# Altium footprint library MyLibrarySum.PcbLib: 208 footprints (part 3 of 13)
Each footprint in its own frame and in the unit in brackets; x right, y up, seen from the top. Pads: shape width x height; smd on the part's side, far side on the other; paste and mask are expansions set on the pad; w line width, h text height; cw(c..) or ccw(c..) is an arc to the next point about the centre after c.
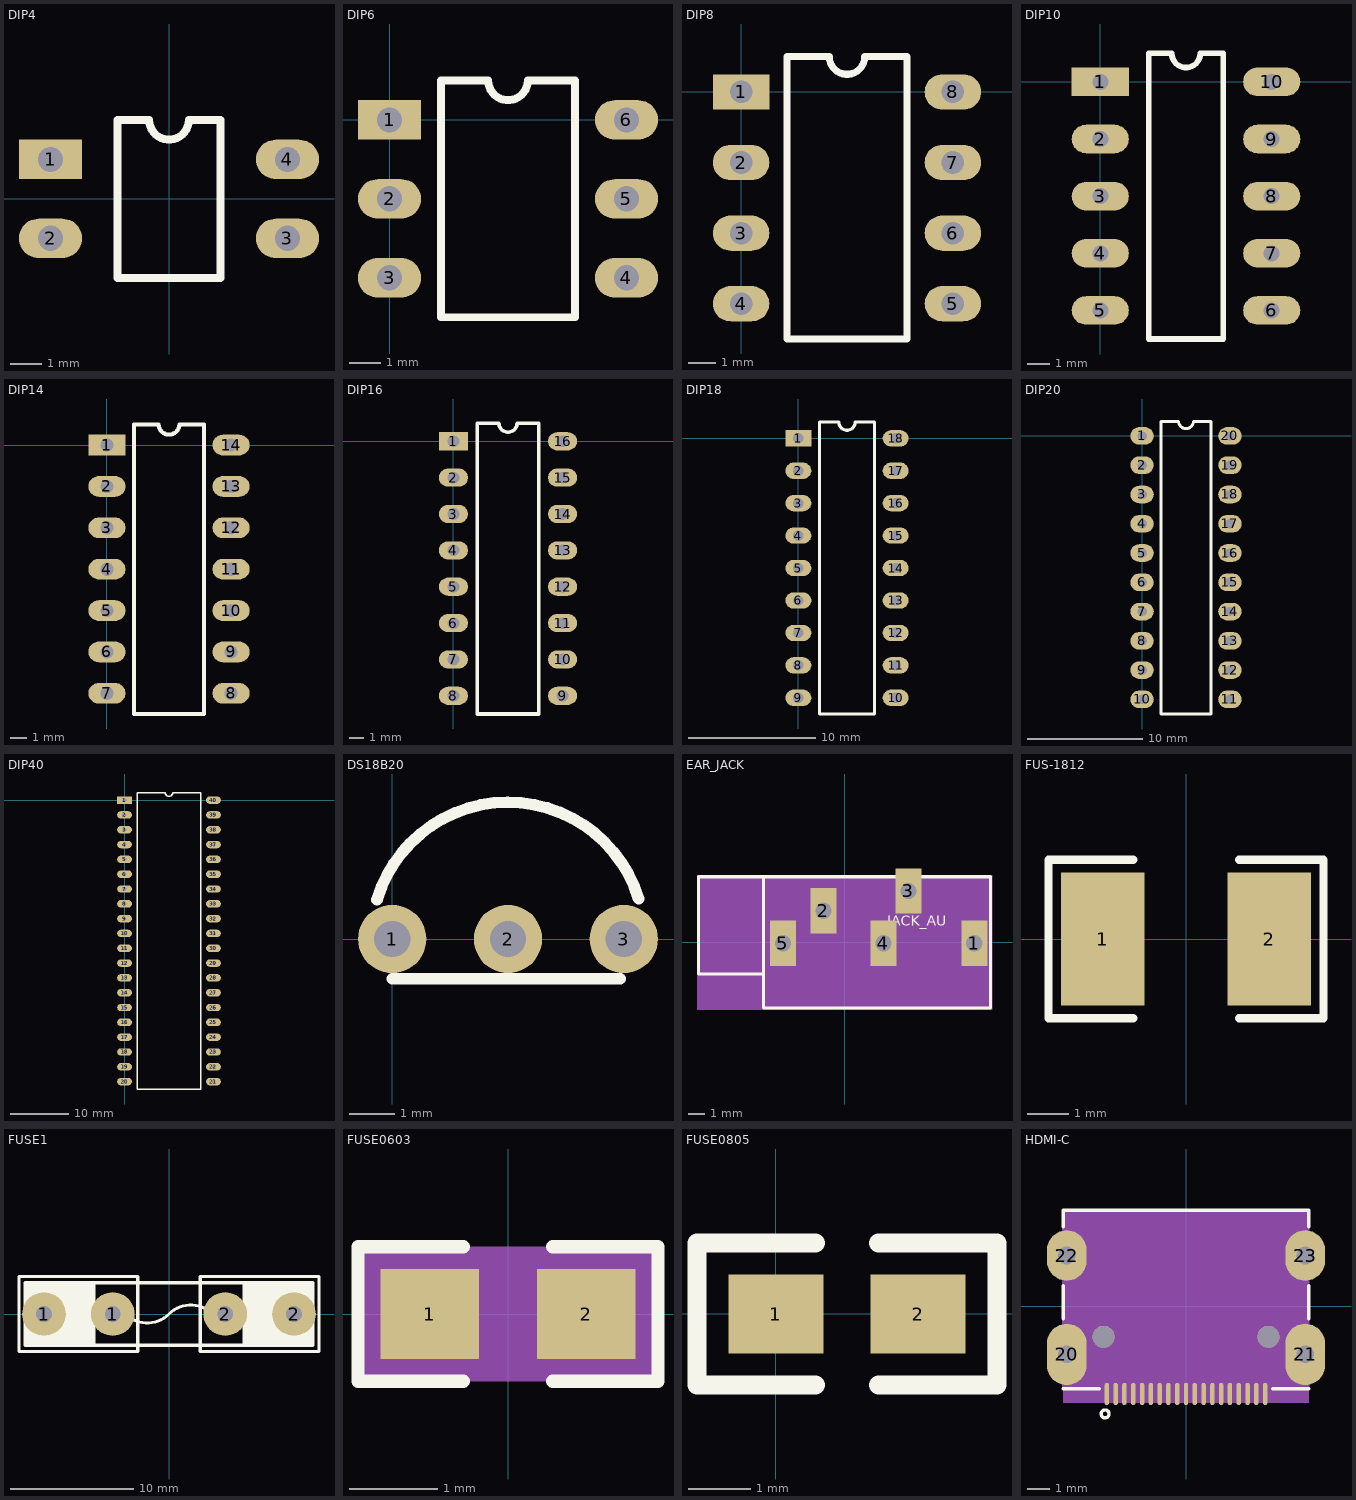
[diagram p2: the footprints below, top view; thin cyan lines are the x and y axes]

## DIP4 [mil]
pads (4):
  rect 80x50 hole 32: 1(-150,50)
  oval 80x50 hole 32: 2(-150,-50) 3(150,-50) 4(150,50)
Top Overlay:
  lines w10: -65,-100 -65,100 -25,100 ccw(c0,100) 25,100 65,100 65,-100 -65,-100
3D body: height 169.69, standoff -129.13, extent -147.48,-125 167.48,93.11

## DIP6 [mil]
pads (6):
  rect 80x50 hole 32: 1(0,0)
  oval 80x50 hole 32: 2(0,-100) 3(0,-200) 4(300,-200) 5(300,-100) 6(300,0)
Top Overlay:
  lines w10: 65,-250 235,-250 235,50 175,50 cw(c150,50) 125,50 65,50 65,-250
3D body: height 169.69, standoff -129.13, extent -17.48,-240 297.48,78.11

## DIP8 [mil]
pads (8):
  rect 80x50 hole 32: 1(0,0)
  oval 80x50 hole 32: 2(0,-100) 3(0,-200) 4(0,-300) 5(300,-300) 6(300,-200) 7(300,-100) 8(300,0)
Top Overlay:
  lines w10: 65,-350 65,50 125,50 ccw(c150,50) 175,50 235,50 235,-350 65,-350
3D body: height 177.17, standoff -137.8, extent -0.54,-357.6 305,67.6

## DIP10 [mil]
pads (10):
  rect 100x50 hole 28: 1(0,0)
  oval 100x50 hole 28: 2(0,-100) 3(0,-200) 4(0,-300) 5(0,-400) 6(300,-400) 7(300,-300) 8(300,-200) 9(300,-100) 10(300,0)
Top Overlay:
  lines w10: 85,-450 215,-450 215,50 175,50 cw(c150,50) 125,50 85,50 85,-450

## DIP14 [mil]
pads (14):
  rect 90x50 hole 32: 1(0,0)
  oval 90x50 hole 32: 2(0,-100) 3(0,-200) 4(0,-300) 5(0,-400) 6(0,-500) 7(0,-600) 8(300,-600) 9(300,-500) 10(300,-400) 11(300,-300) 12(300,-200) 13(300,-100) 14(300,0)
Top Overlay:
  lines w10: 65,-650 65,50 125,50 ccw(c150,50) 175,50 235,50 235,-650 65,-650
3D body: height 179.92, standoff -150, extent 2.13,-662.48 310,102.48

## DIP16 [mil]
pads (16):
  rect 80x50 hole 32: 1(0,0)
  oval 80x50 hole 32: 2(0,-100) 3(0,-200) 4(0,-300) 5(0,-400) 6(0,-500) 7(0,-600) 8(0,-700) 9(300,-700) 10(300,-600) 11(300,-500) 12(300,-400) 13(300,-300) 14(300,-200) 15(300,-100) 16(300,0)
Top Overlay:
  lines w10: 65,-750 235,-750 235,50 175,50 cw(c150,50) 125,50 65,50 65,-750
3D body: height 179.92, standoff -150, extent 0,-710 307.87,54.96

## DIP18 [mil]
pads (18):
  rect 80x50 hole 32: 1(0,0)
  oval 80x50 hole 32: 2(0,-100) 3(0,-200) 4(0,-300) 5(0,-400) 6(0,-500) 7(0,-600) 8(0,-700) 9(0,-800) 10(300,-800) 11(300,-700) 12(300,-600) 13(300,-500) 14(300,-400) 15(300,-300) 16(300,-200) 17(300,-100) 18(300,0)
Top Overlay:
  lines w10: 65,-850 65,50 125,50 ccw(c150,50) 175,50 235,50 235,-850 65,-850
3D body: height 179.92, standoff -150, extent 2.13,-842.48 310,72.48

## DIP20 [mil]
pads (20):
  oval 80x60 hole 32: 1(0,0) 2(0,-100) 3(0,-200) 4(0,-300) 5(0,-400) 6(0,-500) 7(0,-600) 8(0,-700) 9(0,-800) 10(0,-900) 11(300,-900) 12(300,-800) 13(300,-700) 14(300,-600) 15(300,-500) 16(300,-400) 17(300,-300) 18(300,-200) 19(300,-100) 20(300,0)
Top Overlay:
  lines w10: 65,-950 65,50 125,50 ccw(c150,50) 175,50 235,50 235,-950 65,-950
3D body: height 65, standoff -180, extent 0,-937.5 310,77.5

## DIP40 [mm]
pads (40):
  rect 2.54x1.27 hole 0.635: 1(0,0)
  oval 2.54x1.27 hole 0.635: 2(0,-2.54) 3(0,-5.08) 4(0,-7.62) 5(0,-10.16) 6(0,-12.7) 7(0,-15.24) 8(0,-17.78) 9(0,-20.32) 10(0,-22.86) 11(0,-25.4) 12(0,-27.94) 13(0,-30.48) 14(0,-33.02) 15(0,-35.56) 16(0,-38.1) 17(0,-40.64) 18(0,-43.18) 19(0,-45.72) 20(0,-48.26) 21(15.24,-48.26) 22(15.24,-45.72) 23(15.24,-43.18) 24(15.24,-40.64) 25(15.24,-38.1) 26(15.24,-35.56) 27(15.24,-33.02) 28(15.24,-30.48) 29(15.24,-27.94) 30(15.24,-25.4) 31(15.24,-22.86) 32(15.24,-20.32) 33(15.24,-17.78) 34(15.24,-15.24) 35(15.24,-12.7) 36(15.24,-10.16) 37(15.24,-7.62) 38(15.24,-5.08) 39(15.24,-2.54) 40(15.24,0)
Top Overlay:
  lines w0.254: 2.159,-49.53 2.159,1.27 6.985,1.27 ccw(c7.62,1.27) 8.255,1.27 13.081,1.27 13.081,-49.53 2.159,-49.53
3D body: height 5.7, standoff -2.58, extent 0.004,-50.228 15.494,2.222

## DS18B20 [mm]
pads (3):
  round 1.5 hole 0.8: 1(0,0) 2(2.54,0) 3(5.08,0)
Top Overlay:
  lines w0.254: -0.333,0.862 cw(c2.54,0) 5.407,0.885 ; 0,-0.875 5,-0.875

## EAR_JACK [mm] "EAR_JACK"
pads (5):
  rect 1.6x2.8 hole 1: 1(8,-0.05) 2(-1.3,1.95) 3(3.937,3.175) 4(2.4,-0.05) 5(-3.8,-0.05)
Top Overlay:
  lines w0.2: -4.9,4.05 -5,3.95 -5,-1.95 ; -5,-1.95 -9,-1.95 -9,4.05 9,4.05 9,-4.05 -5,-4.05 -5,-1.95
  text "JACK_AU" at 2.62,1.03 h0.64
Mechanical 11:
  text "1" at 8,0.458 h0.64
  text "3" at 4.3,2.458 h0.64
  text "4" at 2.4,0.458 h0.64
  text "2" at -1.3,2.458 h0.64
  text "5" at -3.8,0.458 h0.64
Mechanical 12:
  text ".Designator" at -2.46,1.03 h0.64
Mechanical 13:
  region: -9.1,-4.15 9.1,-4.15 9.1,4.15 -9.1,4.15
3D body: height 0.01, standoff -4.06, extent -6.62,-2.413 5.35,4.921

## FUS-1812 [mm]
pads (2):
  rect 2x3.2 smd: 1(-2,0) 2(2,0)
Top Overlay:
  lines w0.2: -1.27,-1.9 -3.3,-1.9 -3.3,1.9 -1.27,1.9 ; 1.27,-1.9 3.3,-1.9 3.3,1.9 1.27,1.9
3D body: height 1.32, standoff 0, extent -2.41,-1.61 2.41,1.61

## FUSE1 [mil]
pads (4):
  round 140 hole 50: 1(-400,0) 1(-180,0) 2(180,0) 2(400,0)
Top Overlay:
  rectangle: 240,-100 460,100
  rectangle: -460,-100 -240,100
  lines w10: -240,-100 -240,100 ; -140,0 ccw(c-70,70) 0,0 cw(c70,-70) 140,0 ; 240,-100 240,100 ; -480,-120 -100,-120 -100,120 -480,120 -480,0 -480,-120 ; -460,-100 -460,100 440,100 460,100 460,-100 -460,-100 ; 100,-120 480,-120 480,120 100,120 100,-120
3D body: height 259.52, standoff -248.3, extent -418.86,-128.71 418.86,115

## FUSE0603 [mil] "R0603"
pads (2):
  rect 44x40 smd: 1(-35,0) 2(35,0)
Top Overlay:
  lines w5.98: -20,-30 -67.01,-30 -67.01,30 -20,30 ; 20,-30 67.01,-30 67.01,30 20,30
Mechanical 9:
  text "2" at 25,0 h25
  text "1" at -45,0 h25
Mechanical 10:
  region: -65,-30 65,-30 65,30 -65,30

## FUSE0805 [mil]
pads (2):
  rect 60x50 smd: 1(0,-0.06) 2(90,-0.06)
Top Overlay:
  lines w12: 25,-45.06 -50,-45.06 -50,44.94 25,44.94 ; 65,-45.06 140,-45.06 140,44.94 65,44.94
3D body: height 0.39, standoff -23.62, extent -15,-35 110.98,27.99

## HDMI-C [mil] "HDMI-C"
pads (25):
  oval 8x40 smd: 1(-141.73,-156.79) 2(-125.98,-156.79) 3(-110.24,-156.79) 4(-94.49,-156.79) 5(-78.74,-156.79) 6(-62.99,-156.79) 7(-47.24,-156.79) 8(-31.5,-156.79) 9(-15.75,-156.79) 10(0,-156.79) 11(15.75,-156.79) 12(31.5,-156.79) 13(47.24,-156.79) 14(62.99,-156.79) 15(78.74,-156.79) 16(94.49,-156.79) 17(110.24,-156.79) 18(125.98,-156.79) 19(141.73,-156.79)
  oval 70.87x110.24 hole 31.5: 20(-213.58,-85.93) 21(213.58,-85.93)
  oval 70.87x90.55 hole 31.5: 22(-213.58,91.24) 23(213.58,91.24)
  round 39.37 hole 39.37: " "(-147.64,-54.43) " "(147.64,-54.43)
Top Overlay:
  circle w5.98: c-145,-192.5 r7.09
  lines w5.98: -220,-147.5 -155,-147.5 ; -220,-22.5 -220,37.5 ; -220,142.5 -220,172.5 220,172.5 220,142.5 ; 155,-147.5 220,-147.5 ; 220,-22.5 220,37.5
  text ".Designator" at 260,130 h30
Mechanical 11:
  text "18" at 109.98,-206.79 h20
  text "19" at 125.73,-206.79 h20
  text "14" at 46.99,-206.79 h20
  text "15" at 62.74,-206.79 h20
  text "16" at 78.49,-206.79 h20
  text "20" at -195.58,-85.93 h20
  text "4" at -102.49,-206.79 h20
  text "7" at -55.24,-206.79 h20
  text "13" at 31.24,-206.79 h20
  text "10" at -16,-206.79 h20
  text "21" at 231.58,-85.93 h20
  text "22" at -195.58,91.24 h20
  text "23" at 231.58,91.24 h20
  text "1" at -149.73,-206.79 h20
  text "17" at 94.24,-206.79 h20
  text "2" at -133.98,-206.79 h20
  text "9" at -23.75,-206.79 h20
  text "8" at -39.5,-206.79 h20
  text "3" at -118.24,-206.79 h20
  text "11" at -0.25,-206.79 h20
  text "6" at -70.99,-206.79 h20
  text "5" at -86.74,-206.79 h20
  text "12" at 15.5,-206.79 h20
Mechanical 12:
  lines w1: -220.47,-144.98 220.47,-144.98 220.47,169.98 -220.47,169.98 -220.47,-144.98
Mechanical 13:
  region: -220,172.5 220,172.5 220,-172.5 -220,-172.5